# Altium footprint library Supernova Connectors.PcbLib: 303 footprints (part 4 of 19)
Each footprint in its own frame and in the unit in brackets; x right, y up, seen from the top. Pads: shape width x height; smd on the part's side, far side on the other; paste and mask are expansions set on the pad; w line width, h text height; cw(c..) or ccw(c..) is an arc to the next point about the centre after c.
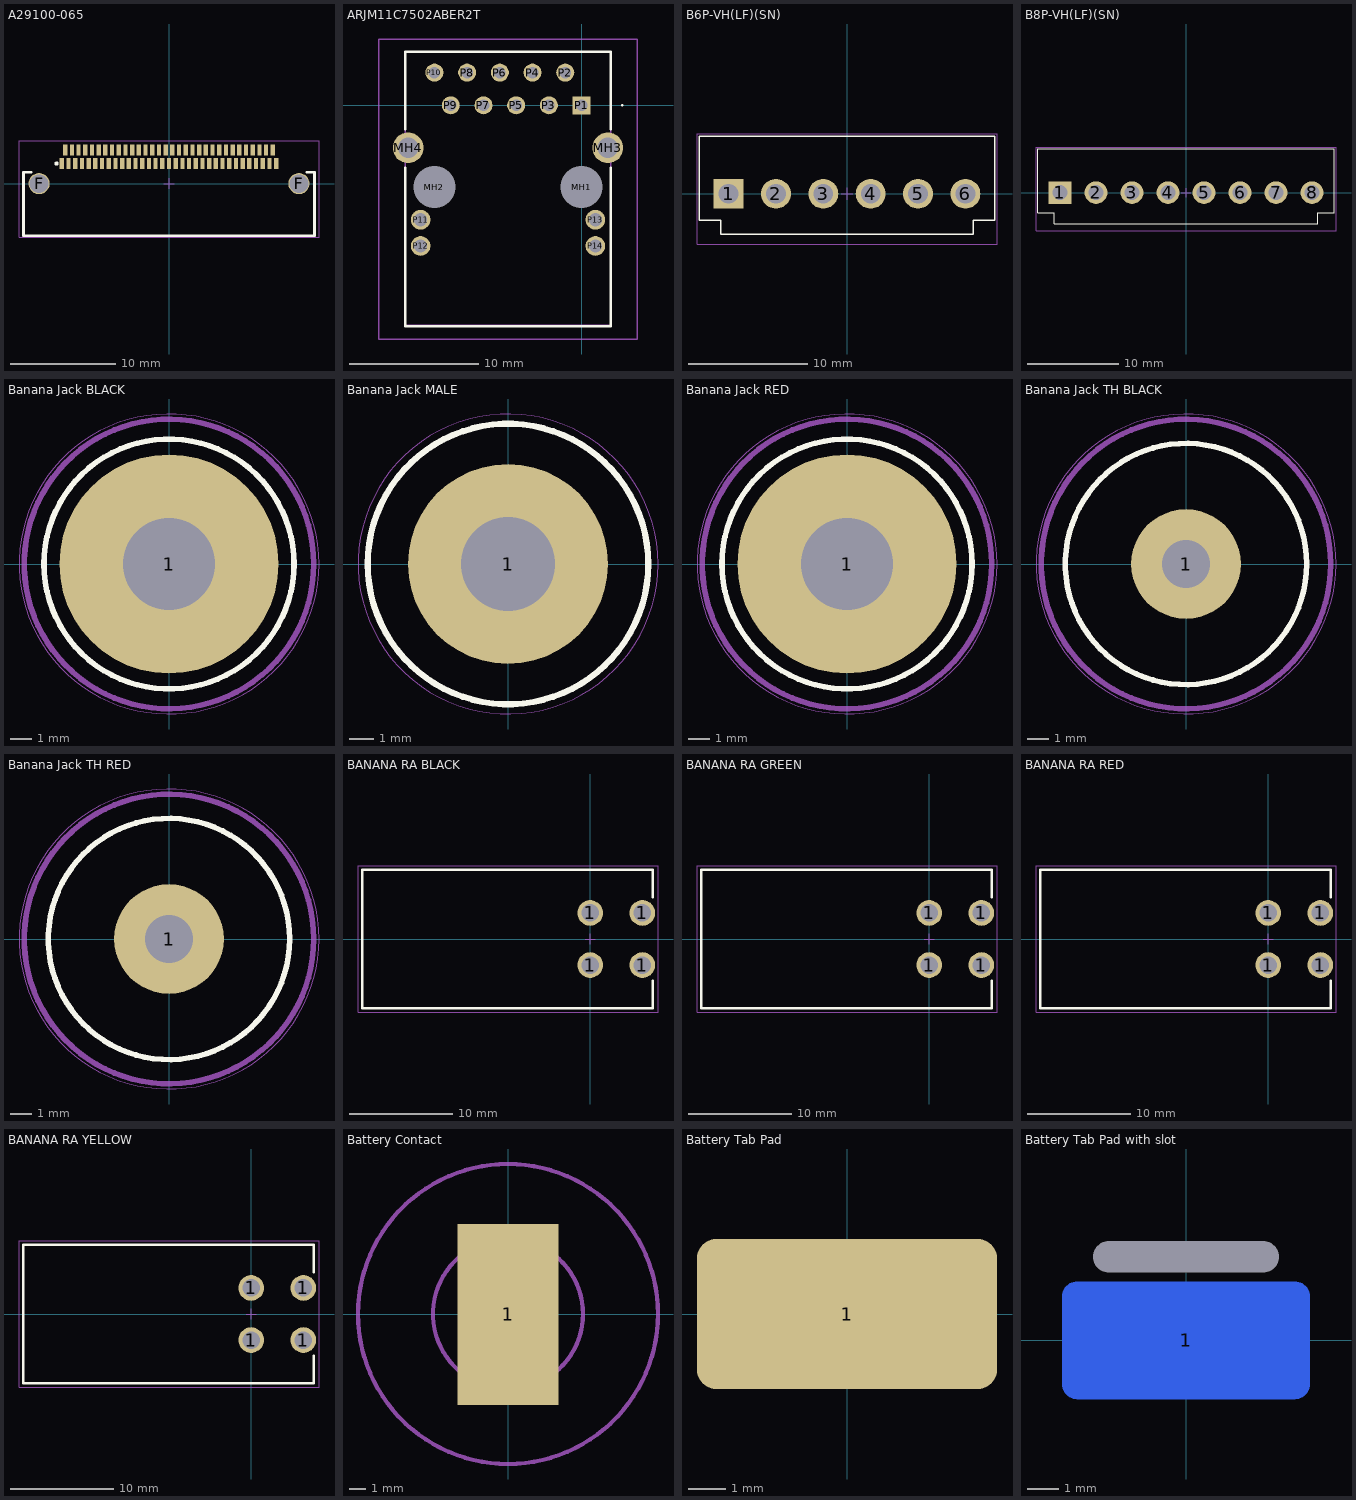
[diagram p3: the footprints below, top view; thin cyan lines are the x and y axes]

## A29100-065 [mil]
pads (67):
  rect 16x41.5 smd mask+0: 1(-400,75.2) 2(-375,75.2) 3(-350,75.2) 4(-325,75.2) 5(-300,75.2) 6(-275,75.2) 7(-250,75.2) 8(-225,75.2) 9(-200,75.2) 10(-175,75.2) 11(-150,75.2) 12(-125,75.2) 13(-100,75.2) 14(-75,75.2) 15(-50,75.2) 16(-25,75.2) 17(0,75.2) 18(25,75.2) 19(50,75.2) 20(75,75.2) 21(100,75.2) 22(125,75.2) 23(150,75.2) 24(175,75.2) 25(200,75.2) 26(225,75.2) 27(250,75.2) 28(275,75.2) 29(300,75.2) 30(325,75.2) 31(350,75.2) 32(375,75.2) 33(400,75.2) 34(-387.5,125.2) 35(-362.5,125.2) 36(-337.5,125.2) 37(-312.5,125.2) 38(-287.5,125.2) 39(-262.5,125.2) 40(-237.5,125.2) 41(-212.5,125.2) 42(-187.5,125.2) 43(-162.5,125.2) 44(-137.5,125.2) 45(-112.5,125.2) 46(-87.5,125.2) 47(-62.5,125.2) 48(-37.5,125.2) 49(-12.5,125.2) 50(12.5,125.2) 51(37.5,125.2) 52(62.5,125.2) 53(87.5,125.2) 54(112.5,125.2) 55(137.5,125.2) 56(162.5,125.2) 57(187.5,125.2) 58(212.5,125.2) 59(237.5,125.2) 60(262.5,125.2) 61(287.5,125.2) 62(312.5,125.2) 63(337.5,125.2) 64(362.5,125.2) 65(387.5,125.2)
  round 78.74 / inner round 78.74 / far side round 118.11 hole 70.08: F(-485.04,0) F(485.04,0)
Top Overlay:
  circle w8: c-420,74.8 r4
  lines w10: -515,43 -543,43 -543,-194 543,-194 543,43 515,43
Top Courtyard:
  lines w1.97: -560,-200 560,-200 560,160 -560,160 -560,-200
  lines w3.94: -19.68,0 19.68,0 ; 0,-19.68 0,19.69
3D body "A29100-065.STEP": height 140.83, standoff 0.03, extent -537.49,-188 537.51,136.01

## ARJM11C7502ABER2T [mm]
pads (18):
  round 1.625 hole 3.25 unplated: MH1(0,-6.35) MH2(-11.43,-6.35)
  round 2.4 hole 1.6: MH3(2.035,-3.3) MH4(-13.465,-3.3)
  rect 1.4x1.4 hole 0.9: P1(0,0)
  round 1.4 hole 0.9: P2(-1.27,2.54) P3(-2.54,0) P4(-3.81,2.54) P5(-5.08,0) P6(-6.35,2.54) P7(-7.62,0) P8(-8.89,2.54) P9(-10.16,0) P10(-11.43,2.54)
  round 1.53 hole 1.02: P11(-12.5,-8.89) P12(-12.5,-10.92) P13(1.07,-8.89) P14(1.07,-10.92)
Top Overlay:
  lines w0.1: 3.1,0 cw(c3.15,0) 3.2,0 cw(c3.15,0) 3.1,0
  lines w0.2: -13.69,-4.85 -13.69,-17.15 2.26,-17.15 2.26,-4.85 ; -13.69,-1.85 -13.69,4.15 2.26,4.15 2.26,-1.85
Top 3D Body:
  lines w0.1: -13.69,-17.1 -13.69,4.15 2.26,4.15 2.26,-17.1 -13.69,-17.1
Top Courtyard:
  lines w0.1: -15.768,-18.15 -15.768,5.15 4.337,5.15 4.337,-18.15 -15.768,-18.15
3D body "ARJM11C7-502-AB-ER2-T.stp": height 15.9, standoff -3, extent -15.099,-17.125 3.8,4.525

## B6P-VH(LF)(SN) [mm]
pads (6):
  rect 2.5x2.5 hole 1.65: 1(-9.9,0)
  round 2.5 hole 1.65: 2(-5.94,0) 3(-1.98,0) 4(1.98,0) 5(5.94,0) 6(9.9,0)
Top Overlay:
  lines w0.127: -12.34,-2.201 -10.54,-2.201 -10.54,-3.4 10.54,-3.4 10.54,-2.201 12.34,-2.201 12.34,4.8 -12.34,4.8 -12.34,-2.201
Top Courtyard:
  lines w0.05: -12.54,-4.2 -12.54,5 12.54,5 12.54,-4.2 -12.54,-4.2
  lines w0.1: -0.5,0 0.5,0 ; 0,-0.5 0,0.5
3D body "JST - VH - Thru (V) - 6Pin - 3.96mm.stp": height 10.36, standoff -3.96, extent -12.198,-4.038 12.197,4.648

## B8P-VH(LF)(SN) [mm]
pads (8):
  rect 2.5x2.5 hole 1.65: 1(-13.86,0)
  round 2.5 hole 1.65: 2(-9.9,0) 3(-5.94,0) 4(-1.98,0) 5(1.98,0) 6(5.94,0) 7(9.9,0) 8(13.86,0)
Top Overlay:
  lines w0.127: -16.3,-2.201 -14.5,-2.201 -14.5,-3.4 14.5,-3.4 14.5,-2.201 16.3,-2.201 16.3,4.8 -16.3,4.8 -16.3,-2.201
Top Courtyard:
  lines w0.05: -16.5,-4.2 -16.5,5 16.5,5 16.5,-4.2 -16.5,-4.2
  lines w0.1: -0.5,0 0.5,0 ; 0,-0.5 0,0.5
3D body "JST - VH - Thru (V) - 8Pin - 3.96mm.stp": height 10.36, standoff -3.96, extent -16.158,-4.039 16.157,4.648

## Banana Jack BLACK [mm]
pads (1):
  round 10 / inner round 10 / far side round 11.43 hole 4.2: 1(0,0)
Top Overlay:
  circle w0.254: c0,0 r5.7
Mechanical 5:
  circle w0.254: c0,0 r6.6
Top Courtyard:
  circle w0.05: c0,0 r6.839
  lines w0.1: -0.5,0 0.5,0 ; 0,-0.5 0,0.5
3D body "03-035B.step": height 21.94, standoff -13.12, extent -6.553,-6.553 6.547,6.547

## Banana Jack MALE [mil]
pads (1):
  round 320 hole 150: 1(0,0)
Top Overlay:
  circle w10: c0,0 r224.41
Top Courtyard:
  circle w1.97: c0,0 r240
  lines w3.94: -19.68,0 19.68,0 ; 0,-19.69 0,19.68
3D body "keystone-PN653.STEP": height 562.04, standoff -500.02, extent -126.44,-108.11 125.28,109.89

## Banana Jack RED [mm]
pads (1):
  round 10 / inner round 10 / far side round 11.43 hole 4.2: 1(0,0)
Top Overlay:
  circle w0.254: c0,0 r5.7
Mechanical 5:
  circle w0.254: c0,0 r6.6
Top Courtyard:
  circle w0.05: c0,0 r6.839
  lines w0.1: -0.5,0 0.5,0 ; 0,-0.5 0,0.5
3D body "03-035R.step": height 21.94, standoff -13.12, extent -6.553,-6.553 6.547,6.547

## Banana Jack TH BLACK [mm]
pads (1):
  round 5 hole 2.2: 1(0,0)
Top Overlay:
  circle w0.254: c0,0 r5.5
Mechanical 5:
  circle w0.254: c0,0 r6.6
Top Courtyard:
  circle w0.05: c0,0 r6.839
  lines w0.1: -0.5,0 0.5,0 ; 0,-0.5 0,0.5
3D body "Banana TH BLACK.STEP": height 21.7, standoff -12, extent -6.75,-6.75 6.75,6.75

## Banana Jack TH RED [mm]
pads (1):
  round 5 hole 2.2: 1(0,0)
Top Overlay:
  circle w0.254: c0,0 r5.5
Mechanical 5:
  circle w0.254: c0,0 r6.6
Top Courtyard:
  circle w0.05: c0,0 r6.839
  lines w0.1: -0.5,0 0.5,0 ; 0,-0.5 0,0.5
3D body "Banana TH RED.STEP": height 21.7, standoff -12, extent -6.75,-6.75 6.75,6.75

## BANANA RA BLACK [mm]
pads (4):
  round 2.5 hole 1.7: 1(0,-2.54) 1(0,2.54) 1(5.08,-2.54) 1(5.08,2.54)
Top Overlay:
  lines w0.254: 6.096,-4.064 6.096,-6.75 -22.2,-6.75 -22.2,6.75 6.096,6.75 6.096,4.064
Top Courtyard:
  lines w0.05: -22.606,-7.112 6.604,-7.112 6.604,7.112 -22.606,7.112 -22.606,-7.112
  lines w0.1: -0.5,0 0.5,0 ; 0,-0.5 0,0.5
3D body "RA Banana BLACK.STEP": height 14.35, standoff -4, extent -22.2,-6.75 5.5,6.75

## BANANA RA GREEN [mm]
pads (4):
  round 2.5 hole 1.7: 1(0,-2.54) 1(0,2.54) 1(5.08,-2.54) 1(5.08,2.54)
Top Overlay:
  lines w0.254: 6.096,-4.064 6.096,-6.75 -22.2,-6.75 -22.2,6.75 6.096,6.75 6.096,4.064
Top Courtyard:
  lines w0.05: -22.606,-7.112 -22.606,7.112 6.604,7.112 6.604,-7.112 -22.606,-7.112
  lines w0.1: -0.5,0 0.5,0 ; 0,-0.5 0,0.5
3D body "Green Banana RA v1.step": height 14.35, standoff -4, extent -22.152,-6.75 5.548,6.75

## BANANA RA RED [mm]
pads (4):
  round 2.5 hole 1.7: 1(0,-2.54) 1(0,2.54) 1(5.08,-2.54) 1(5.08,2.54)
Top Overlay:
  lines w0.254: 6.096,-4.064 6.096,-6.75 -22.2,-6.75 -22.2,6.75 6.096,6.75 6.096,4.064
Top Courtyard:
  lines w0.05: -22.606,-7.112 6.604,-7.112 6.604,7.112 -22.606,7.112 -22.606,-7.112
  lines w0.1: -0.5,0 0.5,0 ; 0,-0.5 0,0.5
3D body "RA Banana RED.STEP": height 14.35, standoff -4, extent -22.2,-6.75 5.5,6.75

## BANANA RA YELLOW [mm]
pads (4):
  round 2.5 hole 1.7: 1(0,-2.54) 1(0,2.54) 1(5.08,-2.54) 1(5.08,2.54)
Top Overlay:
  lines w0.254: 6.096,-4.064 6.096,-6.75 -22.2,-6.75 -22.2,6.75 6.096,6.75 6.096,4.064
Top Courtyard:
  lines w0.05: -22.606,-7.112 -22.606,7.112 6.604,7.112 6.604,-7.112 -22.606,-7.112
  lines w0.1: -0.5,0 0.5,0 ; 0,-0.5 0,0.5
3D body "Green Banana RA v2.step": height 14.35, standoff -4, extent -22.2,-6.75 5.5,6.75

## Battery Contact [mm]
pads (1):
  rect 6.08x10.86 smd paste-0.8: 1(0,-0.02)
Mechanical 5:
  circle w0.254: c0,0 r9
  circle w0.254: c0,0 r4.5

## Battery Tab Pad [mm] "Slot - 1mm x 6mm"
pads (1):
  rrect25% 8x4 smd paste-3: 1(0,0)

## Battery Tab Pad with slot [mm] "Slot - 1mm x 6mm"
pads (2):
  rrect25% 8x3.8 smd far side paste-3: 1(0,0)
  round 0 hole 1 slot 6 at 0 deg unplated: 11(0,2.7)